# Altium schematic symbol library AliPadash.SchLib: 1186 symbols (part 5 of 6) (continued)
## TDA8362-D (continued)
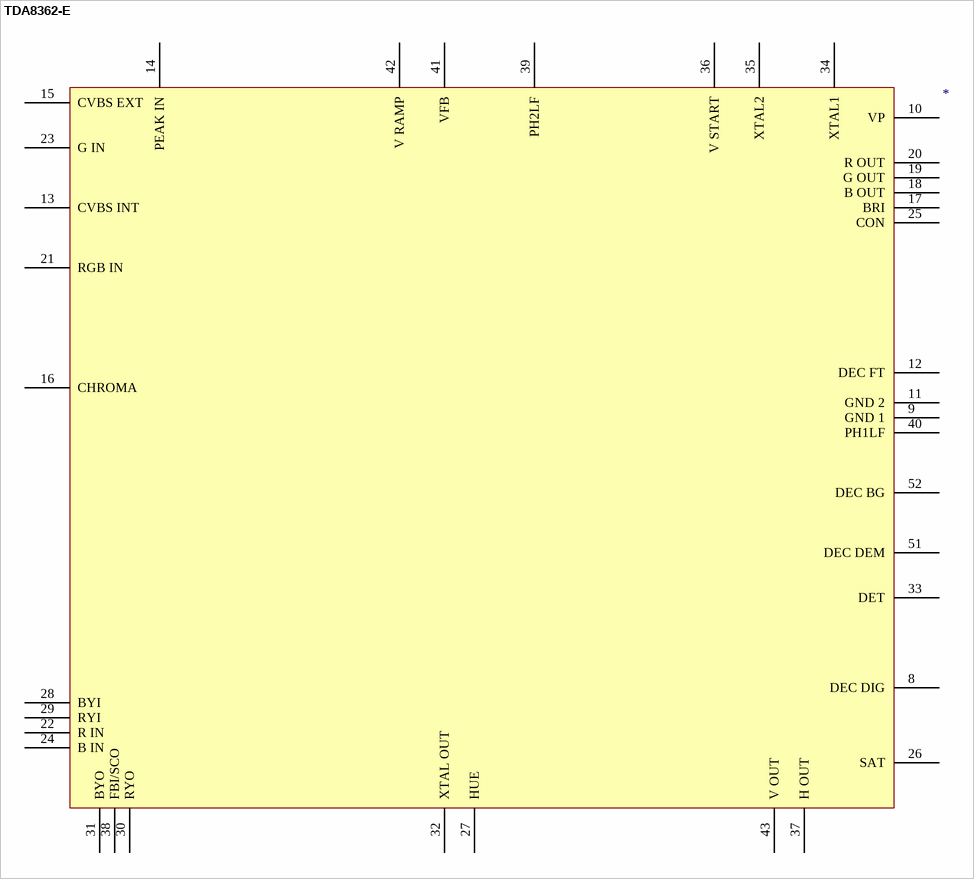
[diagram p69: symbol TDA8362-E]

## TDA8362-E
designator ?
pins: 8 DEC DIG, 9 GND 1, 10 VP, 11 GND 2, 12 DEC FT, 13 CVBS INT, 14 PEAK IN, 15 CVBS EXT, 16 CHROMA, 17 BRI, 18 B OUT, 19 G OUT, 20 R OUT, 21 RGB IN, 22 R IN, 23 G IN, 24 B IN, 25 CON, 26 SAT, 27 HUE, 28 BYI, 29 RYI, 30 RYO, 31 BYO, 32 XTAL OUT, 33 DET, 34 XTAL1, 35 XTAL2, 36 V START, 37 H OUT, 38 FBI/SCO, 39 PH2LF, 40 PH1LF, 41 VFB, 42 V RAMP, 43 V OUT, 51 DEC DEM, 52 DEC BG

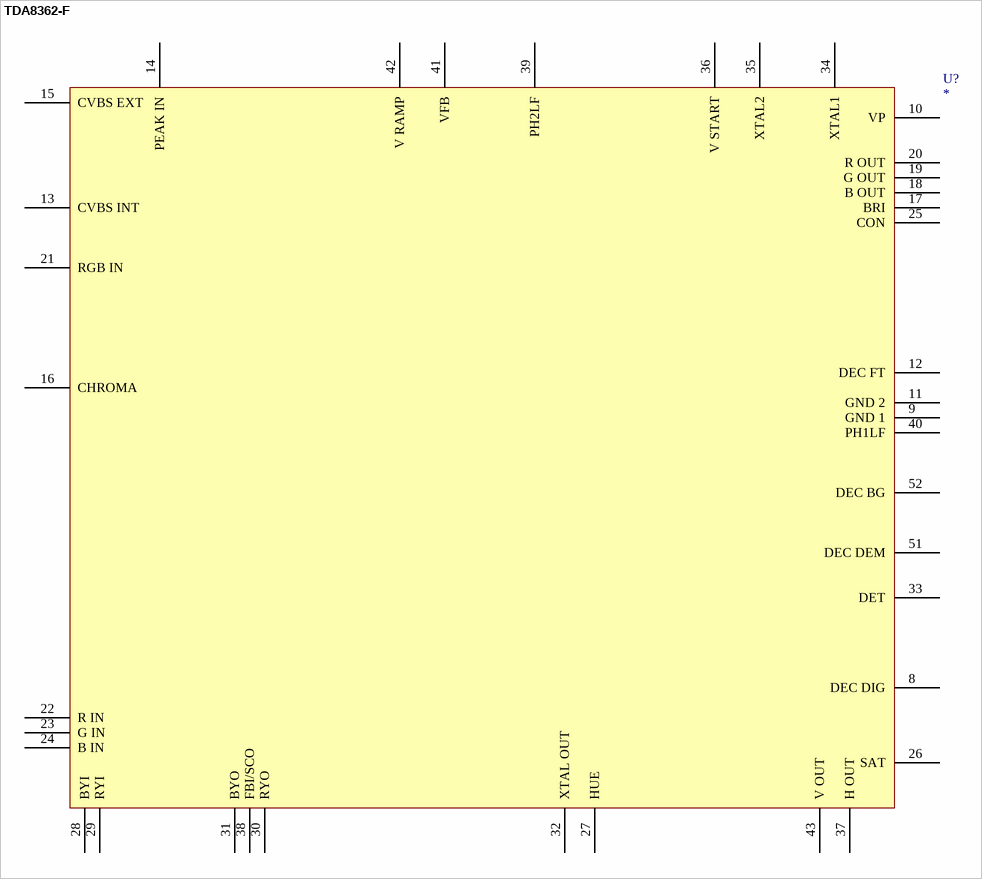
[diagram p70: symbol TDA8362-F]

## TDA8362-F
designator U?
footprint DIL52
pins: 8 DEC DIG, 9 GND 1, 10 VP, 11 GND 2, 12 DEC FT, 13 CVBS INT, 14 PEAK IN, 15 CVBS EXT, 16 CHROMA, 17 BRI, 18 B OUT, 19 G OUT, 20 R OUT, 21 RGB IN, 22 R IN, 23 G IN, 24 B IN, 25 CON, 26 SAT, 27 HUE, 28 BYI, 29 RYI, 30 RYO, 31 BYO, 32 XTAL OUT, 33 DET, 34 XTAL1, 35 XTAL2, 36 V START, 37 H OUT, 38 FBI/SCO, 39 PH2LF, 40 PH1LF, 41 VFB, 42 V RAMP, 43 V OUT, 51 DEC DEM, 52 DEC BG

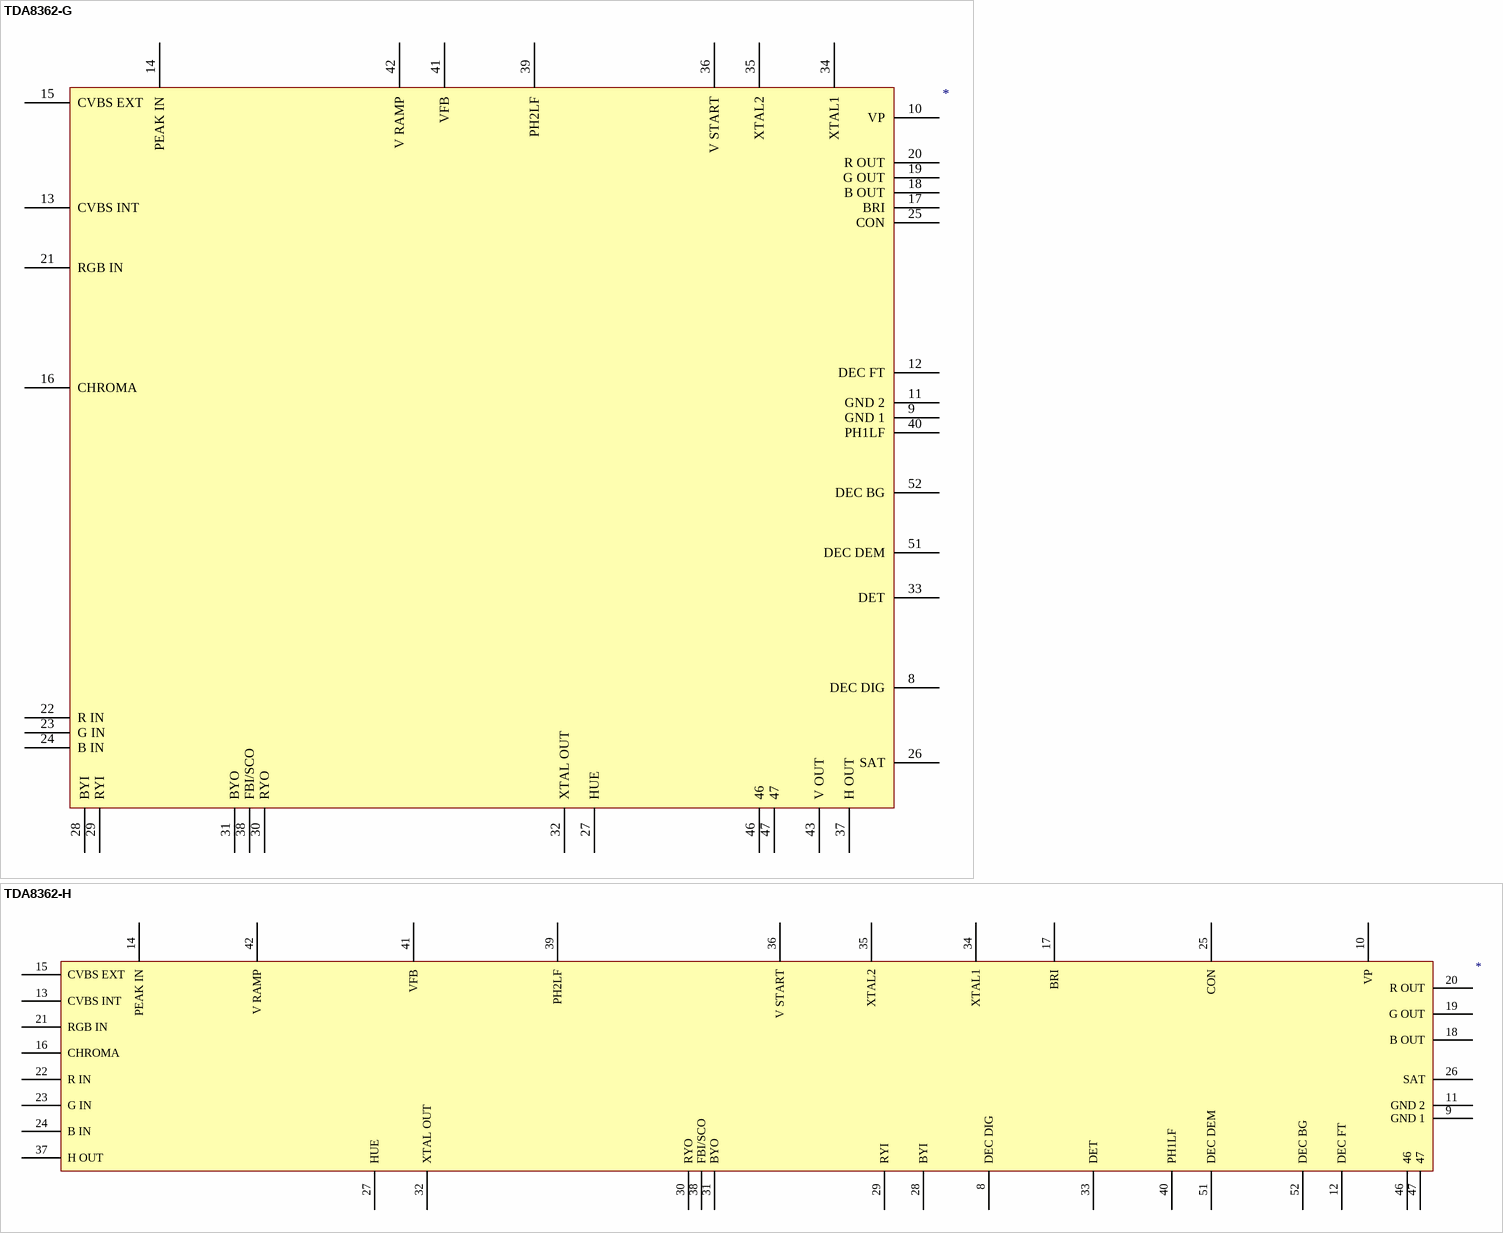
[diagram p71: symbols TDA8362-G to TDA8362-H]

## TDA8362-G
designator ?
pins: 8 DEC DIG, 9 GND 1, 10 VP, 11 GND 2, 12 DEC FT, 13 CVBS INT, 14 PEAK IN, 15 CVBS EXT, 16 CHROMA, 17 BRI, 18 B OUT, 19 G OUT, 20 R OUT, 21 RGB IN, 22 R IN, 23 G IN, 24 B IN, 25 CON, 26 SAT, 27 HUE, 28 BYI, 29 RYI, 30 RYO, 31 BYO, 32 XTAL OUT, 33 DET, 34 XTAL1, 35 XTAL2, 36 V START, 37 H OUT, 38 FBI/SCO, 39 PH2LF, 40 PH1LF, 41 VFB, 42 V RAMP, 43 V OUT, 46, 47, 51 DEC DEM, 52 DEC BG

## TDA8362-H
designator ?
pins: 8 DEC DIG, 9 GND 1, 10 VP, 11 GND 2, 12 DEC FT, 13 CVBS INT, 14 PEAK IN, 15 CVBS EXT, 16 CHROMA, 17 BRI, 18 B OUT, 19 G OUT, 20 R OUT, 21 RGB IN, 22 R IN, 23 G IN, 24 B IN, 25 CON, 26 SAT, 27 HUE, 28 BYI, 29 RYI, 30 RYO, 31 BYO, 32 XTAL OUT, 33 DET, 34 XTAL1, 35 XTAL2, 36 V START, 37 H OUT, 38 FBI/SCO, 39 PH2LF, 40 PH1LF, 41 VFB, 42 V RAMP, 46, 47, 51 DEC DEM, 52 DEC BG

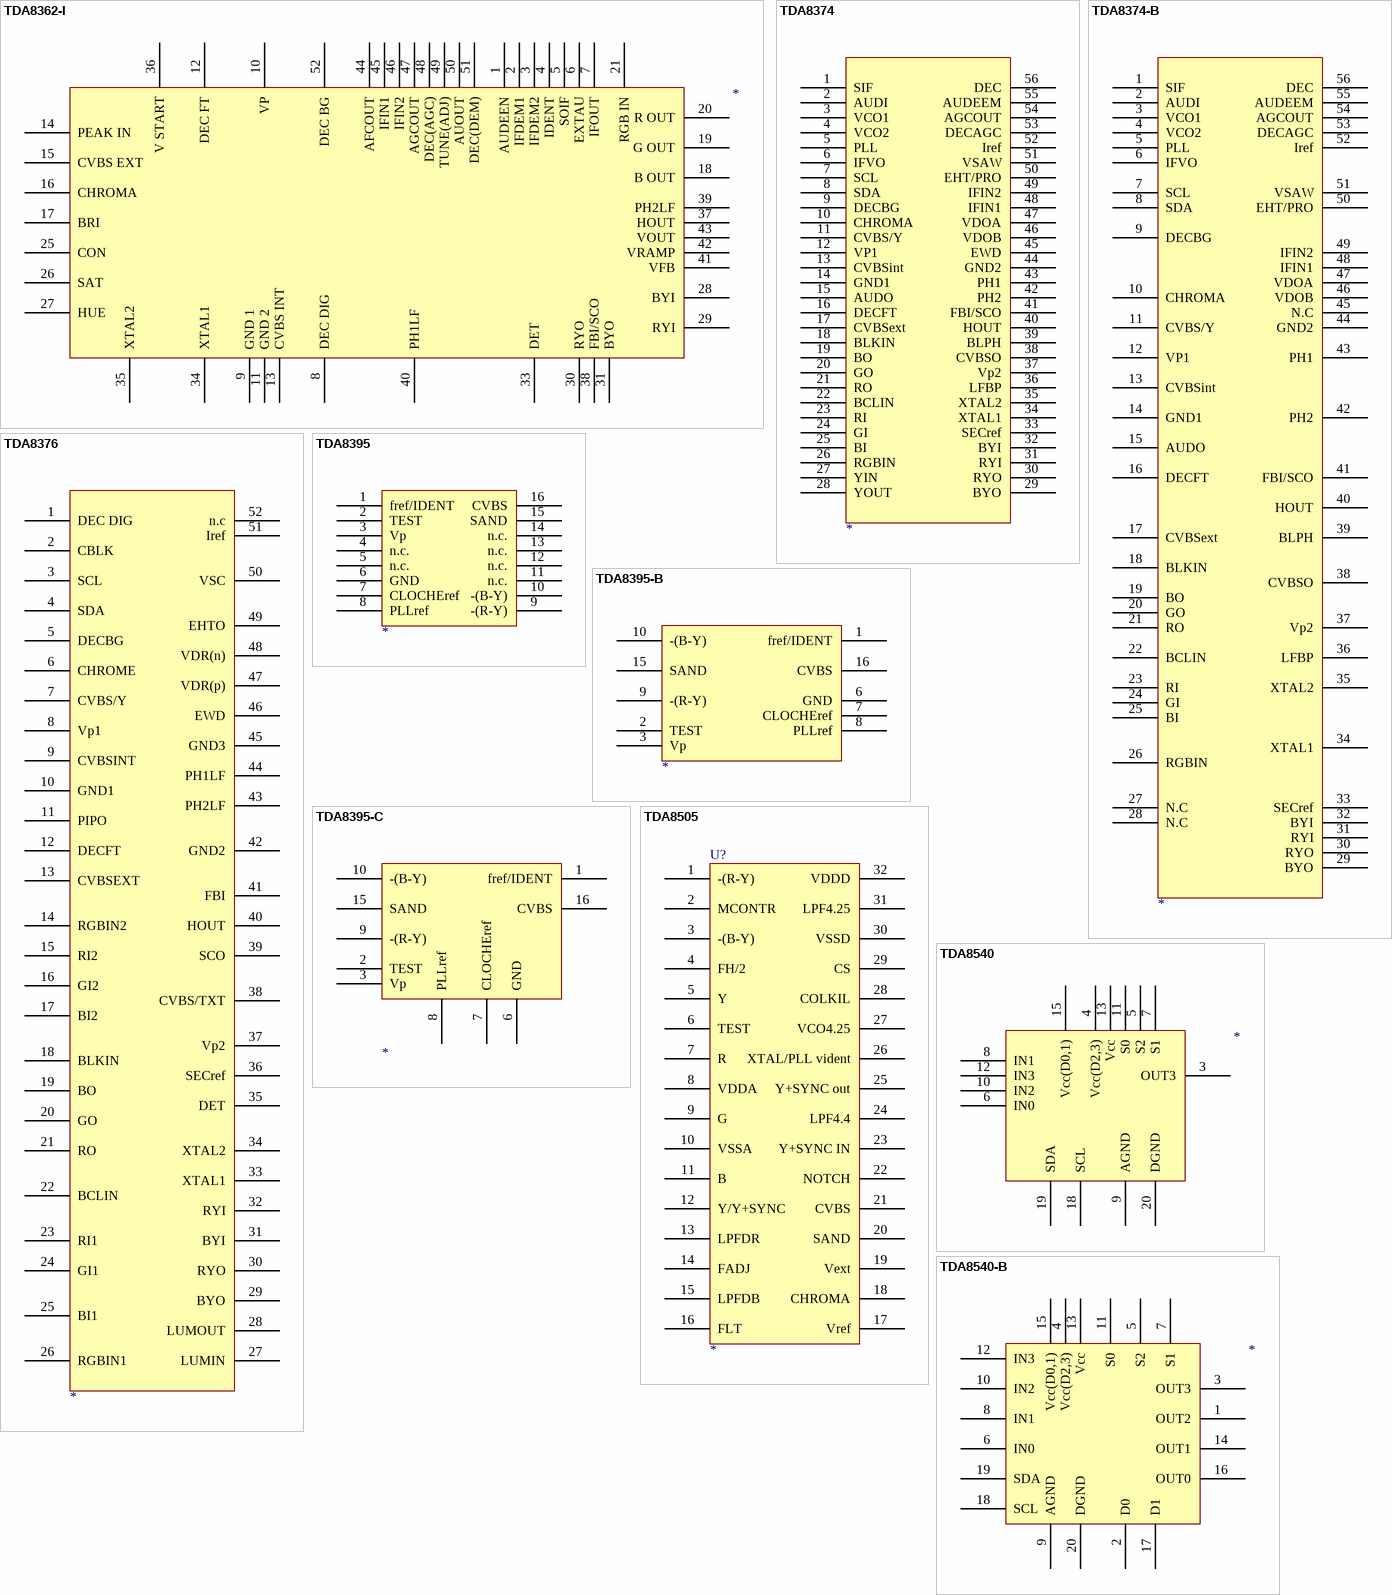
[diagram p72: symbols TDA8362-I to TDA8540-B]

## TDA8362-I
designator ?
pins: 1 AUDEEN, 2 IFDEM1, 3 IFDEM2, 4 IDENT, 5 SOIF, 6 EXTAU, 7 IFOUT, 8 DEC DIG, 9 GND 1, 10 VP, 11 GND 2, 12 DEC FT, 13 CVBS INT, 14 PEAK IN, 15 CVBS EXT, 16 CHROMA, 17 BRI, 18 B OUT, 19 G OUT, 20 R OUT, 21 RGB IN, 25 CON, 26 SAT, 27 HUE, 28 BYI, 29 RYI, 30 RYO, 31 BYO, 33 DET, 34 XTAL1, 35 XTAL2, 36 V START, 37 HOUT, 38 FBI/SCO, 39 PH2LF, 40 PH1LF, 41 VFB, 42 VRAMP, 43 VOUT, 44 AFCOUT, 45 IFIN1, 46 IFIN2, 47 AGCOUT, 48 DEC(AGC), 49 TUNE(ADJ), 50 AUOUT, 51 DEC(DEM), 52 DEC BG

## TDA8374
designator ?
U?
footprint DIP56
pins: 1 SIF, 2 AUDI, 3 VCO1, 4 VCO2, 5 PLL, 6 IFVO, 7 SCL, 8 SDA, 9 DECBG, 10 CHROMA, 11 CVBS/Y, 12 VP1, 13 CVBSint, 14 GND1, 15 AUDO, 16 DECFT, 17 CVBSext, 18 BLKIN, 19 BO, 20 GO, 21 RO, 22 BCLIN, 23 RI, 24 GI, 25 BI, 26 RGBIN, 27 YIN, 28 YOUT, 29 BYO, 30 RYO, 31 RYI, 32 BYI, 33 SECref, 34 XTAL1, 35 XTAL2, 36 LFBP, 37 Vp2, 38 CVBSO, 39 BLPH, 40 HOUT, 41 FBI/SCO, 42 PH2, 43 PH1, 44 GND2, 45 EWD, 46 VDOB, 47 VDOA, 48 IFIN1, 49 IFIN2, 50 EHT/PRO, 51 VSAW, 52 Iref, 53 DECAGC, 54 AGCOUT, 55 AUDEEM, 56 DEC

## TDA8374-B
designator ?
pins: 1 SIF, 2 AUDI, 3 VCO1, 4 VCO2, 5 PLL, 6 IFVO, 7 SCL, 8 SDA, 9 DECBG, 10 CHROMA, 11 CVBS/Y, 12 VP1, 13 CVBSint, 14 GND1, 15 AUDO, 16 DECFT, 17 CVBSext, 18 BLKIN, 19 BO, 20 GO, 21 RO, 22 BCLIN, 23 RI, 24 GI, 25 BI, 26 RGBIN, 27 N.C, 28 N.C, 29 BYO, 30 RYO, 31 RYI, 32 BYI, 33 SECref, 34 XTAL1, 35 XTAL2, 36 LFBP, 37 Vp2, 38 CVBSO, 39 BLPH, 40 HOUT, 41 FBI/SCO, 42 PH2, 43 PH1, 44 GND2, 45 N.C, 46 VDOB, 47 VDOA, 48 IFIN1, 49 IFIN2, 50 EHT/PRO, 51 VSAW, 52 Iref, 53 DECAGC, 54 AGCOUT, 55 AUDEEM, 56 DEC

## TDA8376
designator ?
pins: 1 DEC DIG, 2 CBLK, 3 SCL, 4 SDA, 5 DECBG, 6 CHROME, 7 CVBS/Y, 8 Vp1, 9 CVBSINT, 10 GND1, 11 PIPO, 12 DECFT, 13 CVBSEXT, 14 RGBIN2, 15 RI2, 16 GI2, 17 BI2, 18 BLKIN, 19 BO, 20 GO, 21 RO, 22 BCLIN, 23 RI1, 24 GI1, 25 BI1, 26 RGBIN1, 27 LUMIN, 28 LUMOUT, 29 BYO, 30 RYO, 31 BYI, 32 RYI, 33 XTAL1, 34 XTAL2, 35 DET, 36 SECref, 37 Vp2, 38 CVBS/TXT, 39 SCO, 40 HOUT, 41 FBI, 42 GND2, 43 PH2LF, 44 PH1LF, 45 GND3, 46 EWD, 47 VDR(p), 48 VDR(n), 49 EHTO, 50 VSC, 51 Iref, 52 n.c

## TDA8395
designator ?
U?
footprint DIP16
pins: 1 fref/IDENT, 2 TEST, 3 Vp, 4 n.c., 5 n.c., 6 GND, 7 CLOCHEref, 8 PLLref, 9 -(R-Y), 10 -(B-Y), 11 n.c., 12 n.c., 13 n.c., 14 n.c., 15 SAND, 16 CVBS

## TDA8395-B
designator ?
pins: 1 fref/IDENT, 2 TEST, 3 Vp, 6 GND, 7 CLOCHEref, 8 PLLref, 9 -(R-Y), 10 -(B-Y), 15 SAND, 16 CVBS

## TDA8395-C
designator ?
pins: 1 fref/IDENT, 2 TEST, 3 Vp, 6 GND, 7 CLOCHEref, 8 PLLref, 9 -(R-Y), 10 -(B-Y), 15 SAND, 16 CVBS

## TDA8505
designator U?
footprint DIL32
pins: 1 -(R-Y), 2 MCONTR, 3 -(B-Y), 4 FH/2, 5 Y, 6 TEST, 7 R, 8 VDDA, 9 G, 10 VSSA, 11 B, 12 Y/Y+SYNC, 13 LPFDR, 14 FADJ, 15 LPFDB, 16 FLT, 17 Vref, 18 CHROMA, 19 Vext, 20 SAND, 21 CVBS, 22 NOTCH, 23 Y+SYNC IN, 24 LPF4.4, 25 Y+SYNC out, 26 XTAL/PLL vident, 27 VCO4.25, 28 COLKIL, 29 CS, 30 VSSD, 31 LPF4.25, 32 VDDD

## TDA8540
designator ?
pins: 3 OUT3, 4 Vcc(D2,3), 5 S2, 6 IN0, 7 S1, 8 IN1, 9 AGND, 10 IN2, 11 S0, 12 IN3, 13 Vcc, 15 Vcc(D0,1), 18 SCL, 19 SDA, 20 DGND

## TDA8540-B
designator ?
pins: 1 OUT2, 2 D0, 3 OUT3, 4 Vcc(D2,3), 5 S2, 6 IN0, 7 S1, 8 IN1, 9 AGND, 10 IN2, 11 S0, 12 IN3, 13 Vcc, 14 OUT1, 15 Vcc(D0,1), 16 OUT0, 17 D1, 18 SCL, 19 SDA, 20 DGND

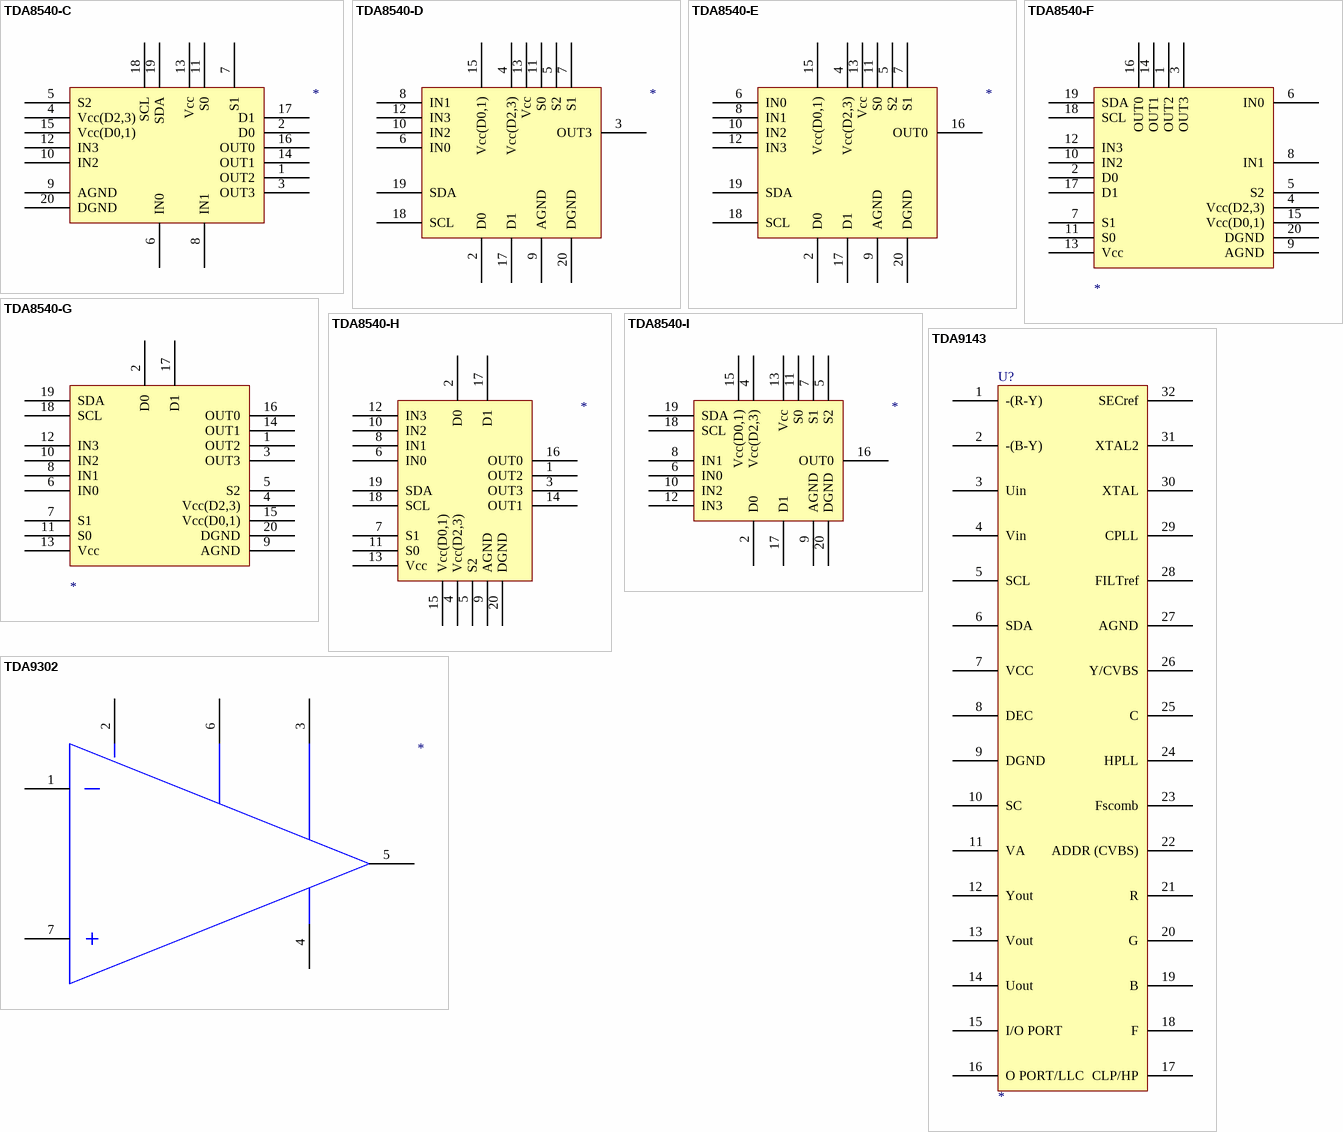
[diagram p73: symbols TDA8540-C to TDA9302]

## TDA8540-C
designator ?
pins: 1 OUT2, 2 D0, 3 OUT3, 4 Vcc(D2,3), 5 S2, 6 IN0, 7 S1, 8 IN1, 9 AGND, 10 IN2, 11 S0, 12 IN3, 13 Vcc, 14 OUT1, 15 Vcc(D0,1), 16 OUT0, 17 D1, 18 SCL, 19 SDA, 20 DGND

## TDA8540-D
designator ?
pins: 2 D0, 3 OUT3, 4 Vcc(D2,3), 5 S2, 6 IN0, 7 S1, 8 IN1, 9 AGND, 10 IN2, 11 S0, 12 IN3, 13 Vcc, 15 Vcc(D0,1), 17 D1, 18 SCL, 19 SDA, 20 DGND

## TDA8540-E
designator ?
pins: 2 D0, 4 Vcc(D2,3), 5 S2, 6 IN0, 7 S1, 8 IN1, 9 AGND, 10 IN2, 11 S0, 12 IN3, 13 Vcc, 15 Vcc(D0,1), 16 OUT0, 17 D1, 18 SCL, 19 SDA, 20 DGND

## TDA8540-F
designator ?
pins: 1 OUT2, 2 D0, 3 OUT3, 4 Vcc(D2,3), 5 S2, 6 IN0, 7 S1, 8 IN1, 9 AGND, 10 IN2, 11 S0, 12 IN3, 13 Vcc, 14 OUT1, 15 Vcc(D0,1), 16 OUT0, 17 D1, 18 SCL, 19 SDA, 20 DGND

## TDA8540-G
designator ?
pins: 1 OUT2, 2 D0, 3 OUT3, 4 Vcc(D2,3), 5 S2, 6 IN0, 7 S1, 8 IN1, 9 AGND, 10 IN2, 11 S0, 12 IN3, 13 Vcc, 14 OUT1, 15 Vcc(D0,1), 16 OUT0, 17 D1, 18 SCL, 19 SDA, 20 DGND

## TDA8540-H
designator ?
pins: 1 OUT2, 2 D0, 3 OUT3, 4 Vcc(D2,3), 5 S2, 6 IN0, 7 S1, 8 IN1, 9 AGND, 10 IN2, 11 S0, 12 IN3, 13 Vcc, 14 OUT1, 15 Vcc(D0,1), 16 OUT0, 17 D1, 18 SCL, 19 SDA, 20 DGND

## TDA8540-I
designator ?
pins: 2 D0, 4 Vcc(D2,3), 5 S2, 6 IN0, 7 S1, 8 IN1, 9 AGND, 10 IN2, 11 S0, 12 IN3, 13 Vcc, 15 Vcc(D0,1), 16 OUT0, 17 D1, 18 SCL, 19 SDA, 20 DGND

## TDA9143
designator U?
footprint DIL32
pins: 1 -(R-Y), 2 -(B-Y), 3 Uin, 4 Vin, 5 SCL, 6 SDA, 7 VCC, 8 DEC, 9 DGND, 10 SC, 11 VA, 12 Yout, 13 Vout, 14 Uout, 15 I/O PORT, 16 O PORT/LLC, 17 CLP/HP, 18 F, 19 B, 20 G, 21 R, 22 ADDR (CVBS), 23 Fscomb, 24 HPLL, 25 C, 26 Y/CVBS, 27 AGND, 28 FILTref, 29 CPLL, 30 XTAL, 31 XTAL2, 32 SECref

## TDA9302
designator ?
pins: 1, 2, 3, 4, 5, 6, 7

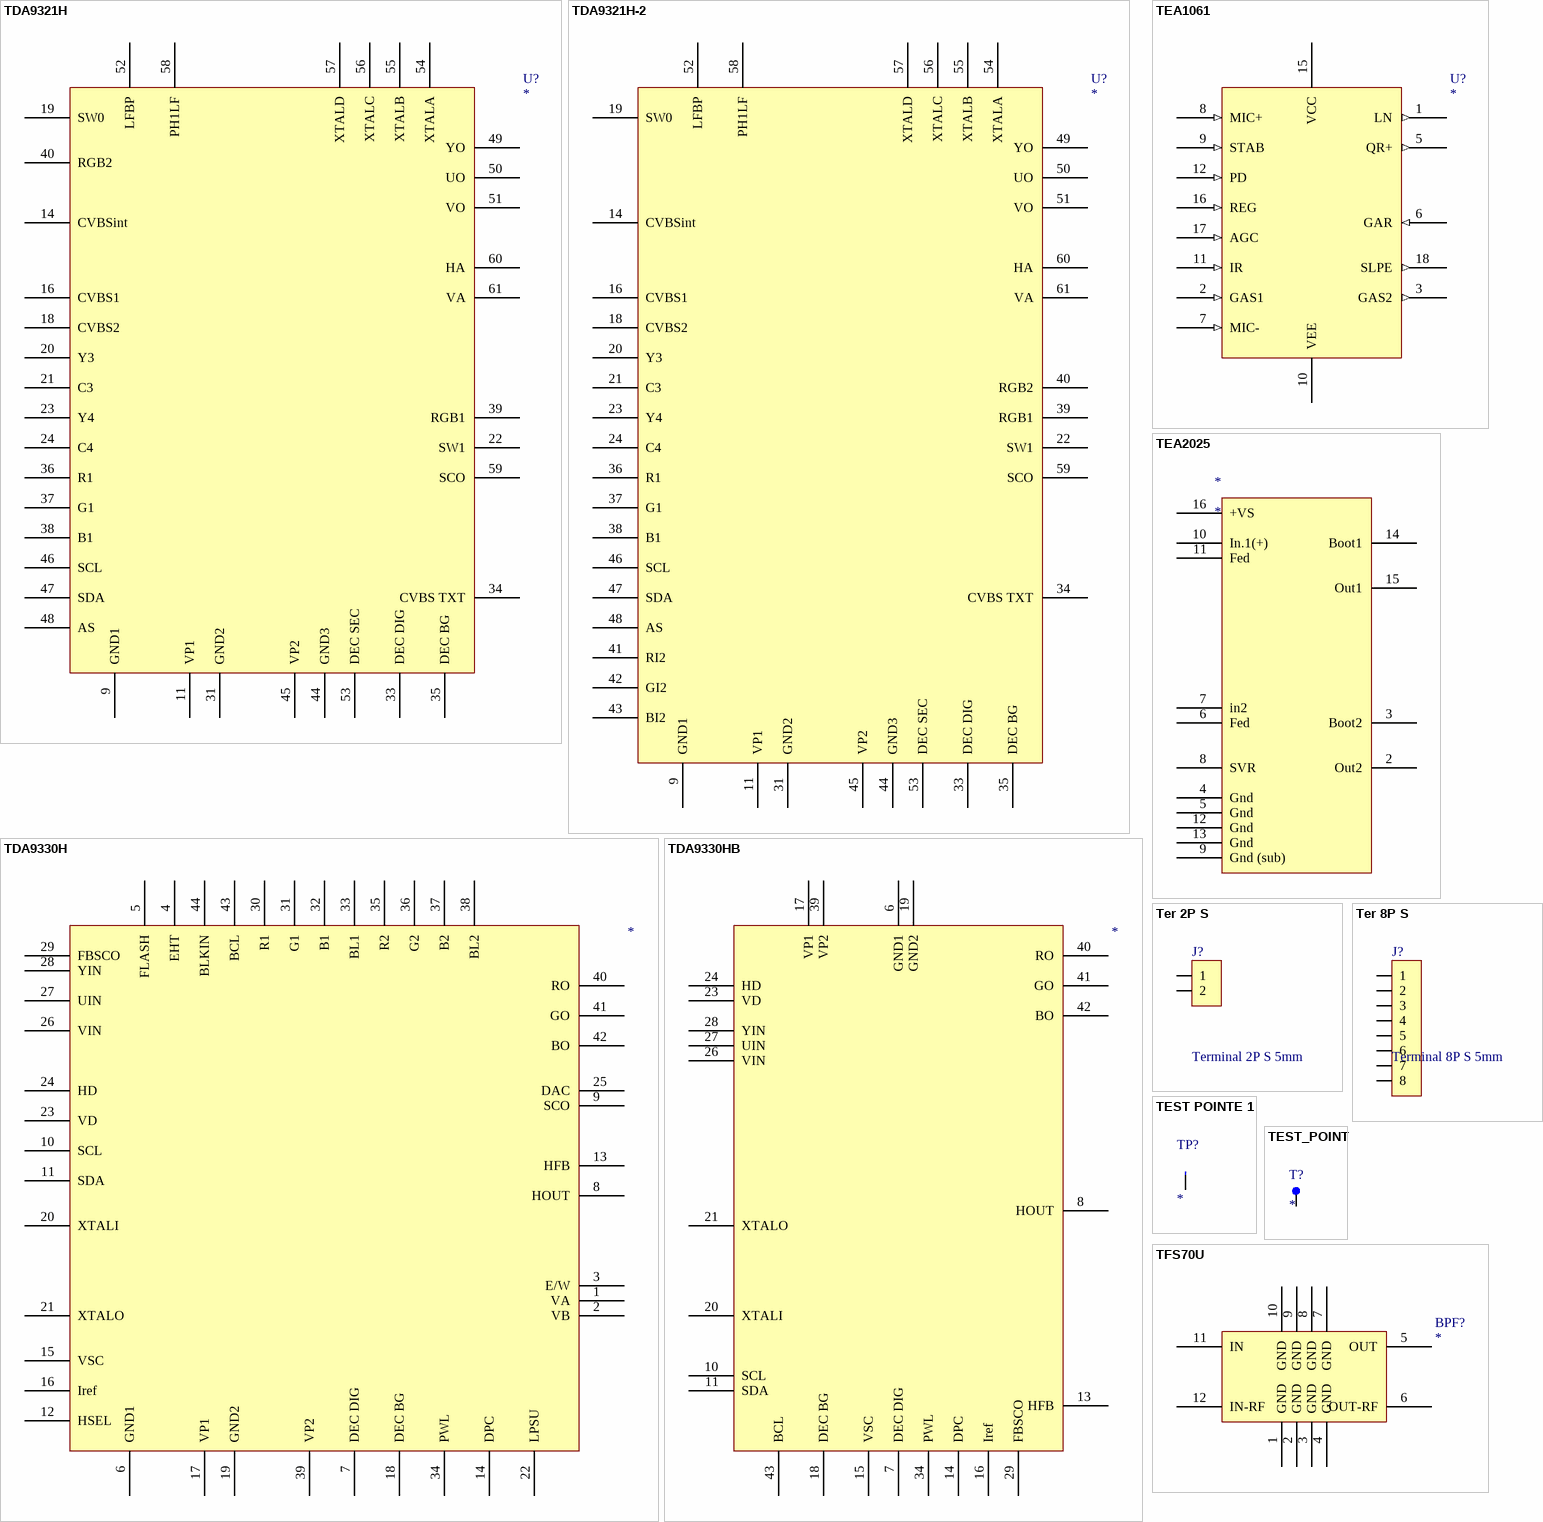
[diagram p74: symbols TDA9321H to TFS70U]

## TDA9321H
designator U?
footprint QFP64-A
pins: 9 GND1, 11 VP1, 14 CVBSint, 16 CVBS1, 18 CVBS2, 19 SW0, 20 Y3, 21 C3, 22 SW1, 23 Y4, 24 C4, 31 GND2, 33 DEC DIG, 34 CVBS TXT, 35 DEC BG, 36 R1, 37 G1, 38 B1, 39 RGB1, 40 RGB2, 44 GND3, 45 VP2, 46 SCL, 47 SDA, 48 AS, 49 YO, 50 UO, 51 VO, 52 LFBP, 53 DEC SEC, 54 XTALA, 55 XTALB, 56 XTALC, 57 XTALD, 58 PH1LF, 59 SCO, 60 HA, 61 VA

## TDA9321H-2
designator U?
footprint QFP64-A
pins: 9 GND1, 11 VP1, 14 CVBSint, 16 CVBS1, 18 CVBS2, 19 SW0, 20 Y3, 21 C3, 22 SW1, 23 Y4, 24 C4, 31 GND2, 33 DEC DIG, 34 CVBS TXT, 35 DEC BG, 36 R1, 37 G1, 38 B1, 39 RGB1, 40 RGB2, 41 RI2, 42 GI2, 43 BI2, 44 GND3, 45 VP2, 46 SCL, 47 SDA, 48 AS, 49 YO, 50 UO, 51 VO, 52 LFBP, 53 DEC SEC, 54 XTALA, 55 XTALB, 56 XTALC, 57 XTALD, 58 PH1LF, 59 SCO, 60 HA, 61 VA

## TDA9330H
designator ?
U?
footprint QFP44-A
pins: 1 VA, 2 VB, 3 E/W, 4 EHT, 5 FLASH, 6 GND1, 7 DEC DIG, 8 HOUT, 9 SCO, 10 SCL, 11 SDA, 12 HSEL, 13 HFB, 14 DPC, 15 VSC, 16 Iref, 17 VP1, 18 DEC BG, 19 GND2, 20 XTALI, 21 XTALO, 22 LPSU, 23 VD, 24 HD, 25 DAC, 26 VIN, 27 UIN, 28 YIN, 29 FBSCO, 30 R1, 31 G1, 32 B1, 33 BL1, 34 PWL, 35 R2, 36 G2, 37 B2, 38 BL2, 39 VP2, 40 RO, 41 GO, 42 BO, 43 BCL, 44 BLKIN

## TDA9330HB
designator ?
U?
footprint QFP44-A
pins: 6 GND1, 7 DEC DIG, 8 HOUT, 10 SCL, 11 SDA, 13 HFB, 14 DPC, 15 VSC, 16 Iref, 17 VP1, 18 DEC BG, 19 GND2, 20 XTALI, 21 XTALO, 23 VD, 24 HD, 26 VIN, 27 UIN, 28 YIN, 29 FBSCO, 34 PWL, 39 VP2, 40 RO, 41 GO, 42 BO, 43 BCL

## TEA1061
designator U?
pins: 1 LN (out), 2 GAS1 (in), 3 GAS2 (out), 5 QR+ (out), 6 GAR (in), 7 MIC- (in), 8 MIC+ (in), 9 STAB (in), 10 VEE, 11 IR (in), 12 PD (in), 15 VCC, 16 REG (in), 17 AGC (in), 18 SLPE (out)

## TEA2025
designator *
pins: 2 Out2, 3 Boot2, 4 Gnd, 5 Gnd, 6 Fed, 7 in2, 8 SVR, 9 Gnd (sub), 10 In.1(+), 11 Fed, 12 Gnd, 13 Gnd, 14 Boot1, 15 Out1, 16 +VS

## Ter 2P S
designator J?, comment Terminal 2P S 5mm
MFAC: DB127V-5.0-2P-GN-S; JLC: C395885
footprint Terminal 2P 5mm
pins: 1, 2

## Ter 8P S
designator J?, comment Terminal 8P S 5mm
MFAC: DB127V-5.0-8P-GN-S; JLC: C430626
footprint Terminal 8P 5mm
pins: 1, 2, 3, 4, 5, 6, 7, 8

## TEST POINTE 1
designator TP?
footprint TEST-POINT3
footprint TP1
pins: 1

## TEST_POINT
designator T?
pins: 1

## TFS70U
designator BPF?
footprint BPF3
pins: 1 GND, 2 GND, 3 GND, 4 GND, 5 OUT, 6 OUT-RF, 7 GND, 8 GND, 9 GND, 10 GND, 11 IN, 12 IN-RF

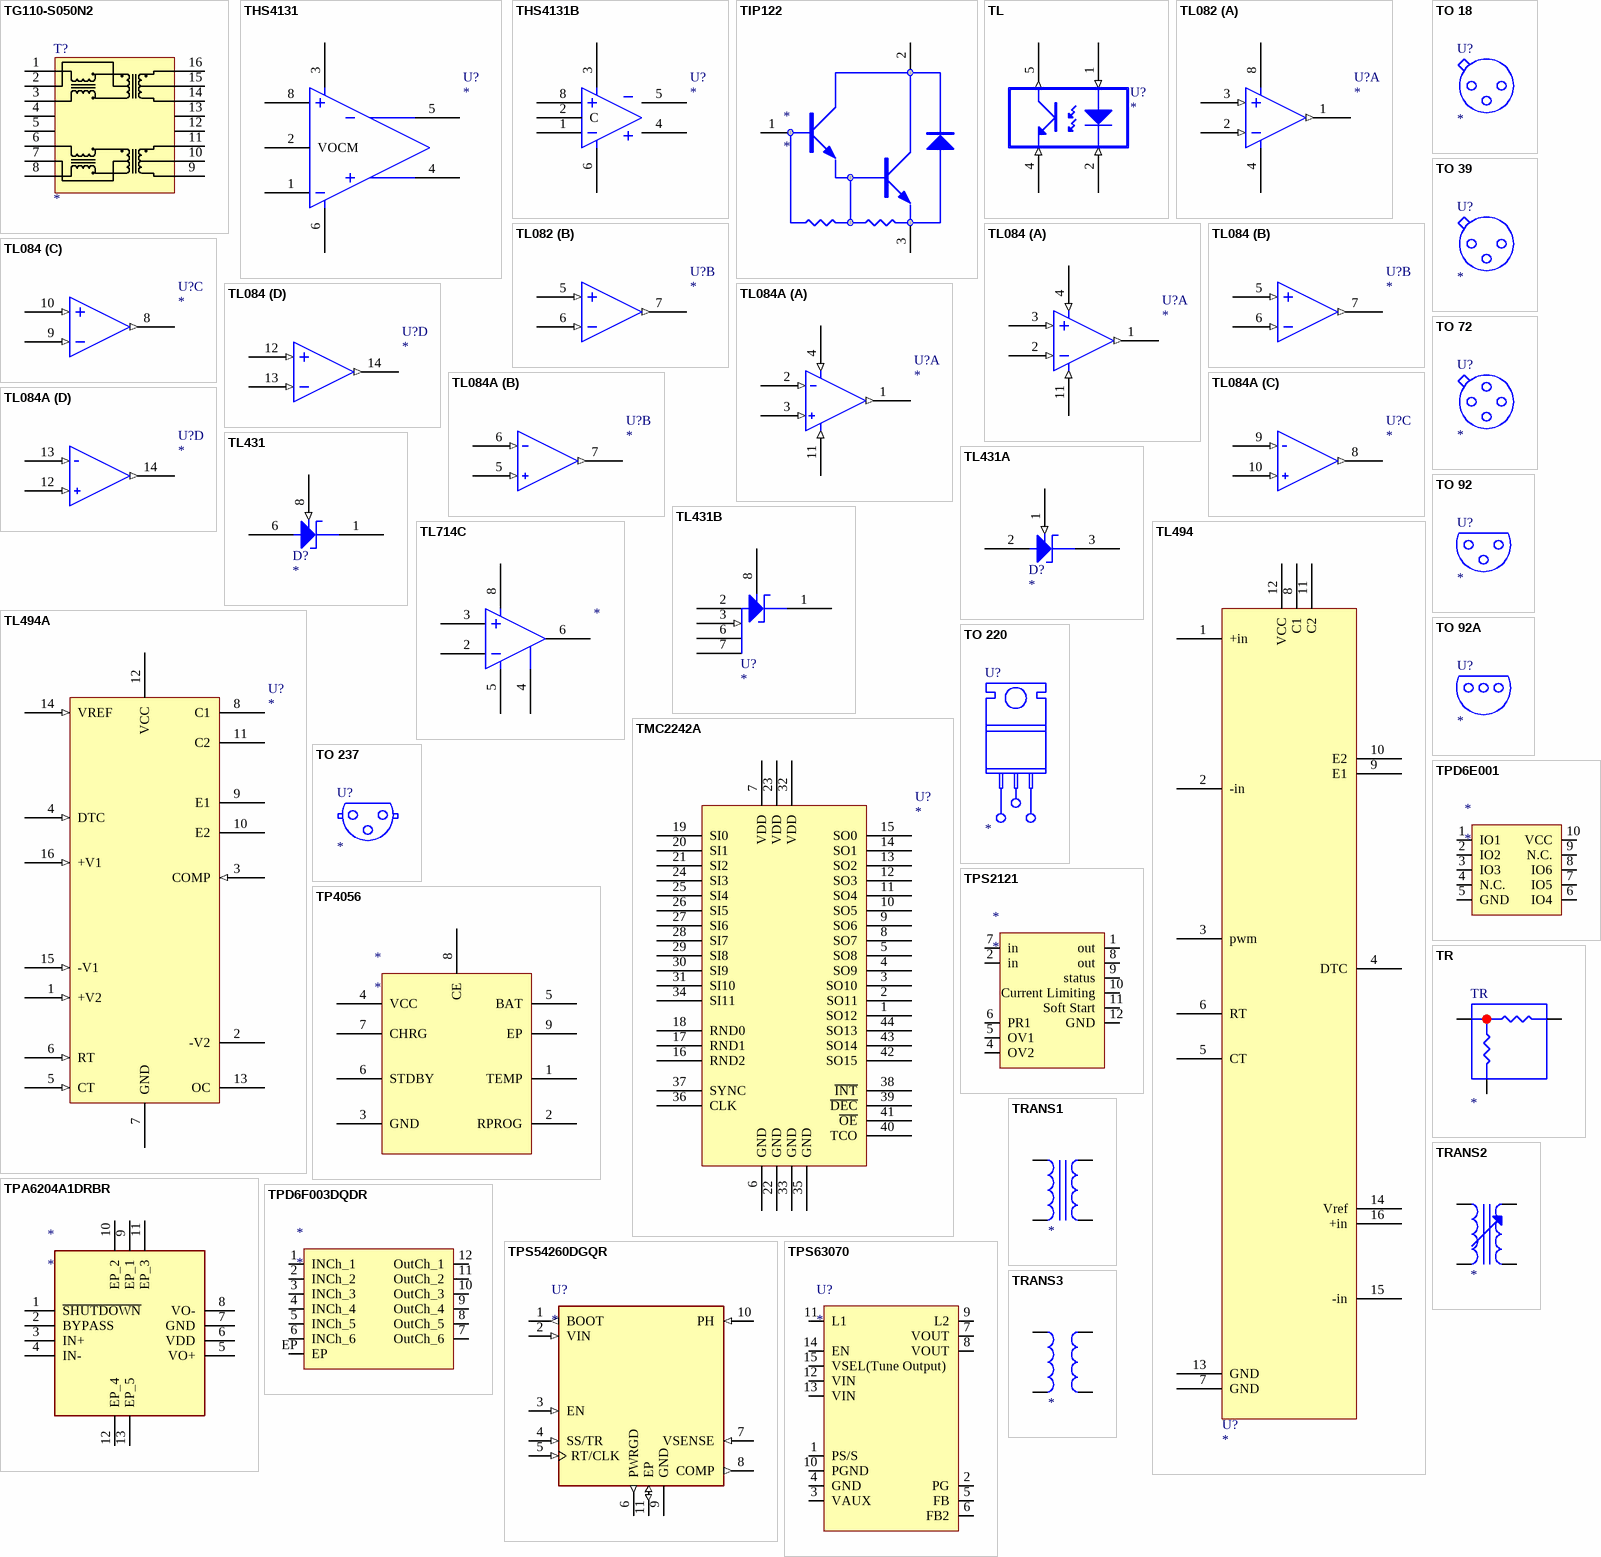
[diagram p75: symbols TG110-S050N2 to TRANS3]

## TG110-S050N2
designator T?
footprint N2
pins: 1, 2, 3, 4, 5, 6, 7, 8, 9, 10, 11, 12, 13, 14, 15, 16